# Altium footprint library GyokuRe.PcbLib: 1248 footprints (part 76 of 78)
Each footprint in its own frame and in the unit in brackets; x right, y up, seen from the top. Pads: shape width x height; smd on the part's side, far side on the other; paste and mask are expansions set on the pad; w line width, h text height; cw(c..) or ccw(c..) is an arc to the next point about the centre after c.
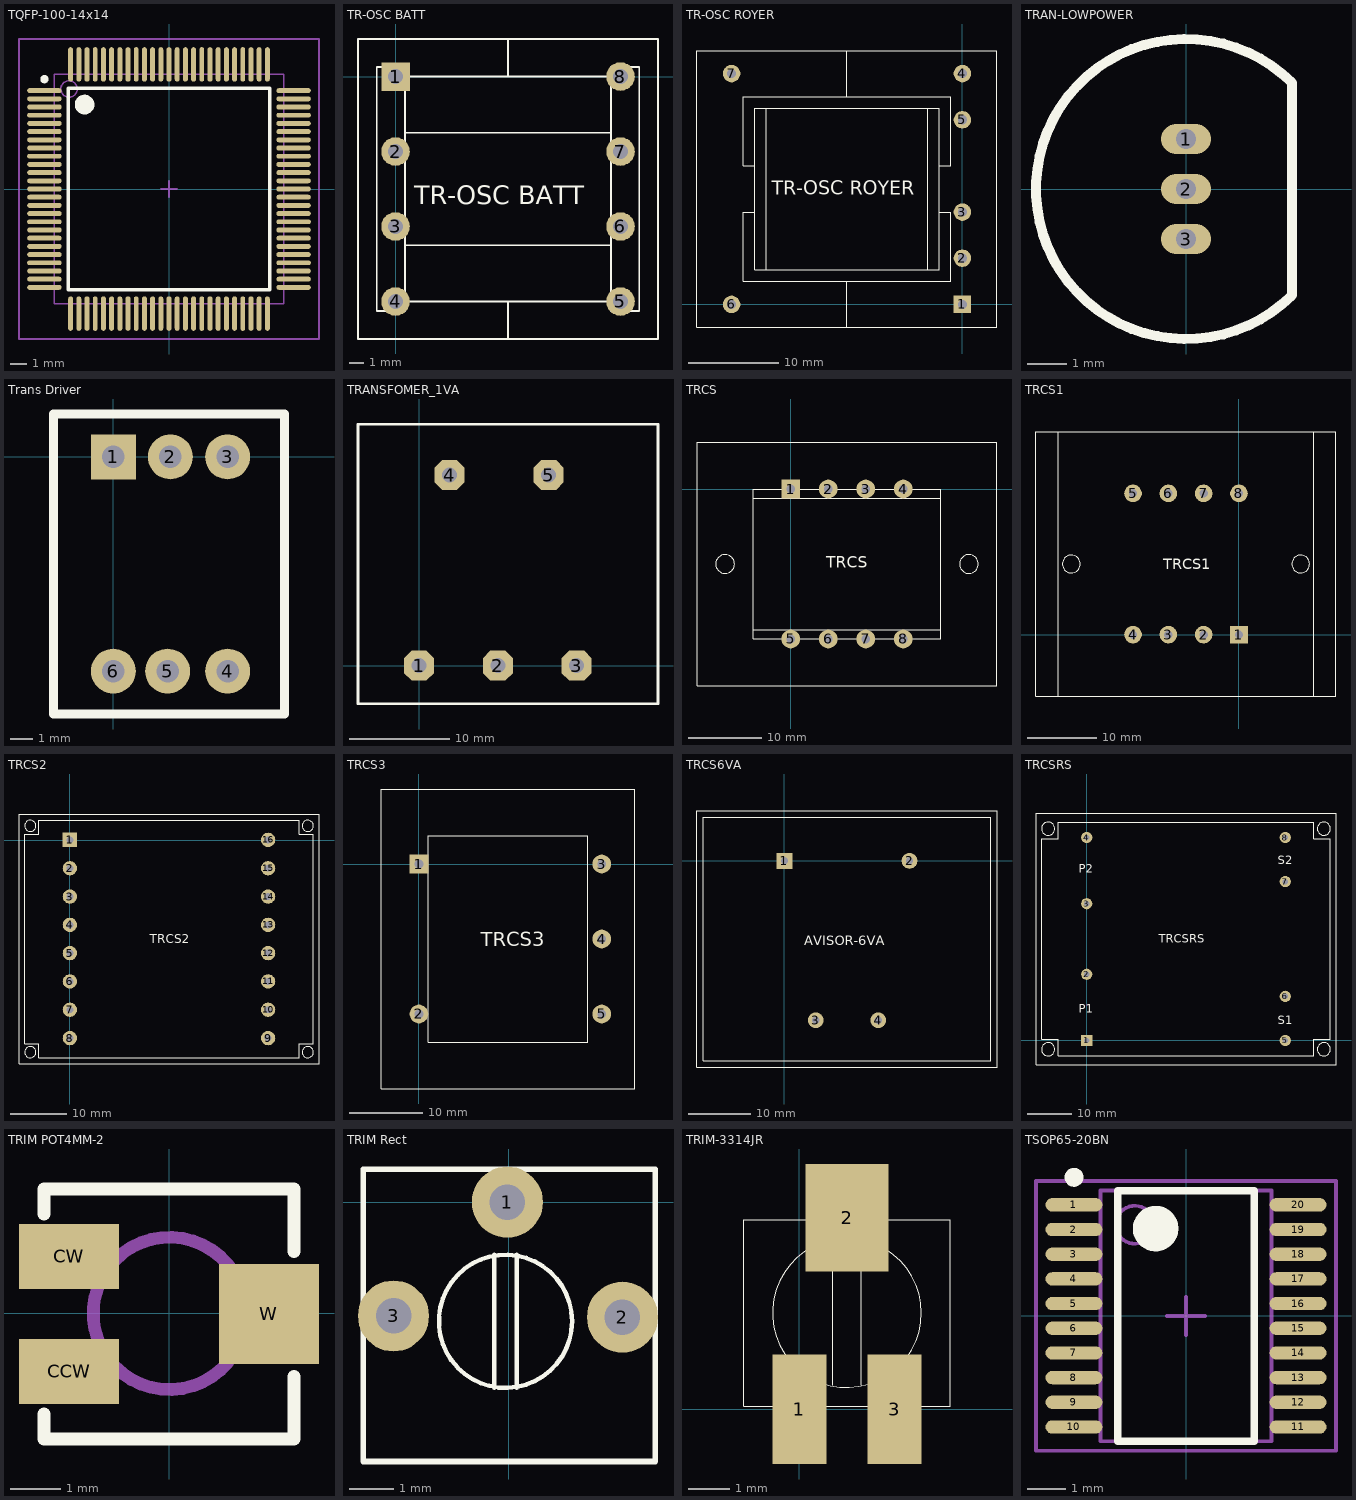
[diagram p75: the footprints below, top view; thin cyan lines are the x and y axes]

## TQFP-100-14x14 [mm] "Thin QFP, 100-Leads, Body 14x14mm, Pitch 0.5mm, IPC Low Density"
height 1.6
pads (100):
  oval 2.1x0.3 smd: 1(-7.6,6) 2(-7.6,5.5) 3(-7.6,5) 4(-7.6,4.5) 5(-7.6,4) 6(-7.6,3.5) 7(-7.6,3) 8(-7.6,2.5) 9(-7.6,2) 10(-7.6,1.5) 11(-7.6,1) 12(-7.6,0.5) 13(-7.6,0) 14(-7.6,-0.5) 15(-7.6,-1) 16(-7.6,-1.5) 17(-7.6,-2) 18(-7.6,-2.5) 19(-7.6,-3) 20(-7.6,-3.5) 21(-7.6,-4) 22(-7.6,-4.5) 23(-7.6,-5) 24(-7.6,-5.5) 25(-7.6,-6) 51(7.6,-6) 52(7.6,-5.5) 53(7.6,-5) 54(7.6,-4.5) 55(7.6,-4) 56(7.6,-3.5) 57(7.6,-3) 58(7.6,-2.5) 59(7.6,-2) 60(7.6,-1.5) 61(7.6,-1) 62(7.6,-0.5) 63(7.6,0) 64(7.6,0.5) 65(7.6,1) 66(7.6,1.5) 67(7.6,2) 68(7.6,2.5) 69(7.6,3) 70(7.6,3.5) 71(7.6,4) 72(7.6,4.5) 73(7.6,5) 74(7.6,5.5) 75(7.6,6)
  oval 0.3x2.1 smd: 26(-6,-7.6) 27(-5.5,-7.6) 28(-5,-7.6) 29(-4.5,-7.6) 30(-4,-7.6) 31(-3.5,-7.6) 32(-3,-7.6) 33(-2.5,-7.6) 34(-2,-7.6) 35(-1.5,-7.6) 36(-1,-7.6) 37(-0.5,-7.6) 38(0,-7.6) 39(0.5,-7.6) 40(1,-7.6) 41(1.5,-7.6) 42(2,-7.6) 43(2.5,-7.6) 44(3,-7.6) 45(3.5,-7.6) 46(4,-7.6) 47(4.5,-7.6) 48(5,-7.6) 49(5.5,-7.6) 50(6,-7.6) 76(6,7.6) 77(5.5,7.6) 78(5,7.6) 79(4.5,7.6) 80(4,7.6) 81(3.5,7.6) 82(3,7.6) 83(2.5,7.6) 84(2,7.6) 85(1.5,7.6) 86(1,7.6) 87(0.5,7.6) 88(0,7.6) 89(-0.5,7.6) 90(-1,7.6) 91(-1.5,7.6) 92(-2,7.6) 93(-2.5,7.6) 94(-3,7.6) 95(-3.5,7.6) 96(-4,7.6) 97(-4.5,7.6) 98(-5,7.6) 99(-5.5,7.6) 100(-6,7.6)
Top Overlay:
  circle w0.6: c-5.15,5.15 r0.3
  circle w0.25: c-7.6,6.7 r0.125
  lines w0.2: -6.15,-6.15 6.15,-6.15 6.15,6.15 -6.15,6.15 -6.15,-6.15
Mechanical 13:
  circle w0.1: c-6.1,6.1 r0.5
  lines w0.1: -7,-7 7,-7 7,7 -7,7 -7,-7
Mechanical 15:
  lines w0.1: -0.5,0 0.5,0 ; 0,-0.5 0,0.5 ; -9.15,-9.15 9.15,-9.15 9.15,9.15 -9.15,9.15 -9.15,-9.15
3D body: height 1.6, standoff 0, extent -7,-7 7,7

## TR-OSC BATT [mil] "Transformer oscillator for battery power - E30"
pads (8):
  rect 76x76 hole 39.37 unplated: 1(0,0)
  round 76 hole 39.37 unplated: 2(0,-200) 3(0,-400) 4(0,-600) 5(600,-600) 6(600,-400) 7(600,-200) 8(600,0)
Top Overlay:
  lines w5: 25,-600 575,-600 ; 25,-450 575,-450 ; 25,-150 575,-150 ; 25,0 575,0 ; 100,0 150,0 ; 300,-700 300,-600 ; 300,0 300,100 ; -100,-700 -100,100 700,100 700,-700 -100,-700 ; -50,-625 25,-625 25,25 -50,25 -50,-625 ; 575,-625 575,25 650,25 650,-625 575,-625
  text "TR-OSC BATT" at 50,-340 h50

## TR-OSC ROYER [mil] "Transformer Royer oscillator - E30"
pads (7):
  rect 76x76 hole 39.37 unplated: 1(0,0)
  round 76 hole 39.37 unplated: 2(0,200) 3(0,400) 4(0,1000) 5(0,800) 6(-1000,0) 7(-1000,1000)
Top Overlay:
  lines w5: -900,400 -950,400 -950,100 -50,100 -50,400 -100,400 ; -900,600 -950,600 -950,900 -50,900 -50,600 -100,600 ; -850,150 -850,850 ; -500,-100 -500,100 ; -500,900 -500,1100 ; -150,150 -150,850 ; -1150,-100 -1150,1100 150,1100 150,-100 -1150,-100 ; -900,150 -900,850 -100,850 -100,150 -900,150
  text "TR-OSC ROYER" at -825,475 h60.8

## TRAN-LOWPOWER [mil] "TO, Flat Index; 3 In-Line, Axial Leads; Body Dia. 4.5mm; Leads 0.51 x 0.48 mm (max)"
height 270.08
pads (3):
  oval 50x30 hole 20: 1(0,50) 2(0,0) 3(0,-50)
Top Overlay:
  lines w10: 106.07,-106.07 cw(c0,0) 106.07,106.07 106.07,-106.07
3D body "SW3dPS-TO-92A.STEP": height 314.96, standoff -118.11, extent -100,-94.48 54.72,94.49

## Trans Driver [mm] "driver transformer"
pads (6):
  rect 2x2 hole 1: 1(0,0)
  round 2 hole 1: 2(2.54,0) 3(5.08,0) 4(5.08,-9.525) 5(2.413,-9.525) 6(0,-9.525)
Top Overlay:
  lines w0.4: -2.667,1.905 -2.667,-11.43 7.62,-11.43 7.62,1.905 -2.54,1.905

## TRANSFOMER_1VA [mm]
pads (5):
  oct 3x3 hole 1.5: 1(0,0) 2(7.874,0) 3(15.748,0) 4(3.048,19.05) 5(12.954,19.05)
Top Overlay:
  lines w0.254: -5.334,24.13 23.876,24.13 23.876,-3.81 -6.096,-3.81 -6.096,24.13 -5.08,24.13
3D body "User Library-xfmr_BEI_HF24E2.step": height 34.57, standoff -2.97, extent -8.352,-4.765 27.148,26.106

## TRCS [mm] "Transformer Power 3VA - Body 40x32 mm"
pads (8):
  rect 2.54x2.54 hole 1.2: 1(0,0)
  round 2.54 hole 1.2: 2(5.08,0) 3(10.16,0) 4(15.24,0) 5(0,-20.32) 6(5.08,-20.32) 7(10.16,-20.32) 8(15.24,-20.32)
Top Overlay:
  circle w0.127: c24.13,-10.16 r1.27
  circle w0.127: c-8.89,-10.16 r1.27
  lines w0.127: -5.08,-19.05 20.32,-19.05 ; -5.08,-1.27 20.32,-1.27 ; -12.7,-26.67 -12.7,6.35 27.94,6.35 27.94,-26.67 -12.7,-26.67 ; -5.08,-20.32 -5.08,0 20.32,0 20.32,-20.32 -5.08,-20.32
  text "TRCS" at 4.826,-10.668 h1.54

## TRCS1 [mm] "Transformer Power 3.5VA - Body 44x38 mm - GBC TYPE"
pads (8):
  rect 2.54x2.54 hole 1.2: 1(0,0)
  round 2.54 hole 1.2: 2(-5.08,0) 3(-10.16,0) 4(-15.24,0) 5(-15.24,20.32) 6(-10.16,20.32) 7(-5.08,20.32) 8(0,20.32)
Top Overlay:
  circle w0.127: c8.89,10.16 r1.27
  circle w0.127: c-24.13,10.16 r1.27
  lines w0.127: -26.035,-8.89 -26.035,29.21 ; 10.795,-8.89 10.795,29.21 ; -29.21,-8.89 -29.21,29.21 13.97,29.21 13.97,-8.89 -29.21,-8.89
  text "TRCS1" at -10.922,9.398 h1.54

## TRCS2 [mil] "Transformer Power 5VA - Body 54x44 mm"
pads (16):
  rect 100x100 hole 47.24: 1(0,3)
  round 100 hole 47.24: 2(0,-194) 3(0,-391) 4(0,-588) 5(0,-784) 6(0,-981) 7(0,-1178) 8(0,-1375) 9(1378,-1375) 10(1378,-1178) 11(1378,-981) 12(1378,-784) 13(1378,-588) 14(1378,-391) 15(1378,-194) 16(1378,3)
Top Overlay:
  circle w5: c1654,101 r39
  circle w5: c1654,-1473 r39
  circle w5: c-276,-1473 r39
  circle w5: c-276,101 r39
  lines w5: -354,-1552 1732,-1552 1732,180 -354,180 -354,-1552 ; -315,-1414 -217,-1414 -217,-1513 1594,-1513 1594,-1414 1693,-1414 1693,42 1594,42 1594,141 -217,141 -217,42 -315,42 -315,-1414
  text "TRCS2" at 553.91,-716.02 h60.04

## TRCS3 [mm] "Transformer Power 3VA - Body 40x35 mm"
pads (5):
  rect 2.54x2.54 hole 1.2: 1(0,0)
  round 2.54 hole 1.2: 2(0,-20.32) 3(24.765,0) 4(24.765,-10.16) 5(24.765,-20.32)
Top Overlay:
  lines w0.127: -5.08,-30.48 -5.08,10.16 29.21,10.16 29.21,-30.48 -5.08,-30.48 ; 1.27,-24.13 1.27,3.81 22.86,3.81 22.86,-24.13 1.27,-24.13
  text "TRCS3" at 8.357,-11.125 h1.93

## TRCS6VA [mm] "Transformer"
pads (4):
  rect 2.54x2.54 hole 1.2: 1(0,0)
  round 2.54 hole 1.2: 2(20,0) 3(5,-25.5) 4(15,-25.5)
Top Overlay:
  lines w0.127: -14,-33 34,-33 34,8 -14,8 -14,-33 ; -13,-32 33,-32 33,7 -13,7 -13,-32
  text "AVISOR-6VA" at 3.175,-13.462 h1.54

## TRCSRS [mm] "Transformer Power 6VA - Body 68x57 mm RS type"
pads (8):
  rect 2.54x2.54 hole 1.2: 1(0,0)
  round 2.54 hole 1.2: 2(0,15) 3(0,31) 4(0,46) 5(45,0) 6(45,10) 7(45,36) 8(45,46)
Top Overlay:
  circle w0.127: c53.75,-2 r1.5
  circle w0.127: c53.75,48 r1.5
  circle w0.127: c-8.75,48 r1.5
  circle w0.127: c-8.75,-2 r1.5
  lines w0.127: -11.5,-5.5 -11.5,51.5 56.5,51.5 56.5,-5.5 -11.5,-5.5 ; -10.25,0.25 -10.25,45.75 -6.5,45.75 -6.5,49.5 51.5,49.5 51.5,45.75 55.25,45.75 55.25,0.25 51.5,0.25 51.5,-3.5 -6.5,-3.5 -6.5,0.25 -10.25,0.25
  text "S1" at 43.278,3.695 h1.93
  text "S2" at 43.278,39.89 h1.93
  text "P1" at -1.807,6.235 h1.93
  text "P2" at -1.807,37.985 h1.93
  text "TRCSRS" at 16.308,22.11 h1.93

## TRIM POT4MM-2 [mm] "Bien tro tinh chinh"
pads (3):
  rect 2x1.3 smd: CCW(-2.008,-1.162) CW(-2.008,1.138)
  rect 2x2 smd: W(1.992,-0.012)
Top Overlay:
  lines w0.254: -2.508,-2.012 -2.508,-2.512 2.492,-2.512 2.492,-1.262 ; -2.508,1.988 -2.508,2.488 2.492,2.488 2.492,1.238
Mechanical 2:
  circle w0.254: c0,0 r1.524
3D body: height 3.05, standoff 0, extent -1.519,0.132 1.519,1.525
3D body: height 3.05, standoff 0, extent -1.519,-1.525 1.519,-0.132
3D body: height 0.64, standoff 0, extent 1.143,-0.889 2.921,0.889
3D body: height 0.64, standoff 0, extent -2.921,-1.651 -1.143,-0.635
3D body: height 0.64, standoff 0, extent -2.921,0.635 -1.143,1.651
3D body: height 2.54, standoff 0, extent -2.54,-2.413 2.54,2.413
3D body: height 2.67, standoff 0, extent -1.436,-1.436 1.436,1.436

## TRIM Rect [mm]
pads (3):
  round 1.6 hole 0.8: 1(-0.025,0) 2(2.565,-2.591) 3(-2.591,-2.565)
Top Overlay:
  circle w0.1: c-0.069,-2.686 r1.5
  lines w0.1: -0.319,-4.186 -0.319,-1.186 ; 0.181,-4.186 0.181,-1.186
  lines w0.127: -3.277,-5.842 3.302,-5.842 3.302,0.737 -3.277,0.737 -3.277,-5.842
3D body "POT1.STEP": height 4.4, standoff -3, extent -3.275,-5.867 3.325,0.733

## TRIM-3314JR [mm]
pads (3):
  rect 1.3x2.65 smd: 1(0,0) 3(2.3,0)
  rect 2x2.6 smd: 2(1.15,4.625)
Top Overlay:
  circle w0.025: c1.15,2.325 r1.8
  lines w0.025: 0.8,0.575 0.8,4.075 ; 1.5,0.575 1.5,4.075 ; -1.35,0.075 3.65,0.075 3.65,4.575 -1.35,4.575 -1.35,0.075

## TSOP65-20BN [mm] "TSOP, 20-Leads, Body 6.5x4.4mm, Pitch 0.65mm, IPC Medium Density"
height 1.2
pads (20):
  oval 1.5x0.35 smd: 1(-2.95,2.925) 2(-2.95,2.275) 3(-2.95,1.625) 4(-2.95,0.975) 5(-2.95,0.325) 6(-2.95,-0.325) 7(-2.95,-0.975) 8(-2.95,-1.625) 9(-2.95,-2.275) 10(-2.95,-2.925) 11(2.95,-2.925) 12(2.95,-2.275) 13(2.95,-1.625) 14(2.95,-0.975) 15(2.95,-0.325) 16(2.95,0.325) 17(2.95,0.975) 18(2.95,1.625) 19(2.95,2.275) 20(2.95,2.925)
Top Overlay:
  circle w0.25: c-2.95,3.65 r0.125
  circle w0.6: c-0.8,2.3 r0.3
  lines w0.2: -1.8,-3.3 -1.8,3.3 1.8,3.3 1.8,-3.3 -1.8,-3.3
Mechanical 13:
  circle w0.1: c-1.35,2.4 r0.5
  lines w0.1: -2.25,-3.3 -2.25,3.3 2.25,3.3 2.25,-3.3 -2.25,-3.3
Mechanical 15:
  lines w0.1: -0.5,0 0.5,0 ; 0,-0.5 0,0.5 ; -3.95,-3.55 -3.95,3.55 3.95,3.55 3.95,-3.55 -3.95,-3.55
3D body: height 1.2, standoff 0, extent -2.25,-3.3 2.25,3.3